# Altium footprint library TarabusLibrary.PcbLib: 591 footprints (part 11 of 37)
Each footprint in its own frame and in the unit in brackets; x right, y up, seen from the top. Pads: shape width x height; smd on the part's side, far side on the other; paste and mask are expansions set on the pad; w line width, h text height; cw(c..) or ccw(c..) is an arc to the next point about the centre after c.
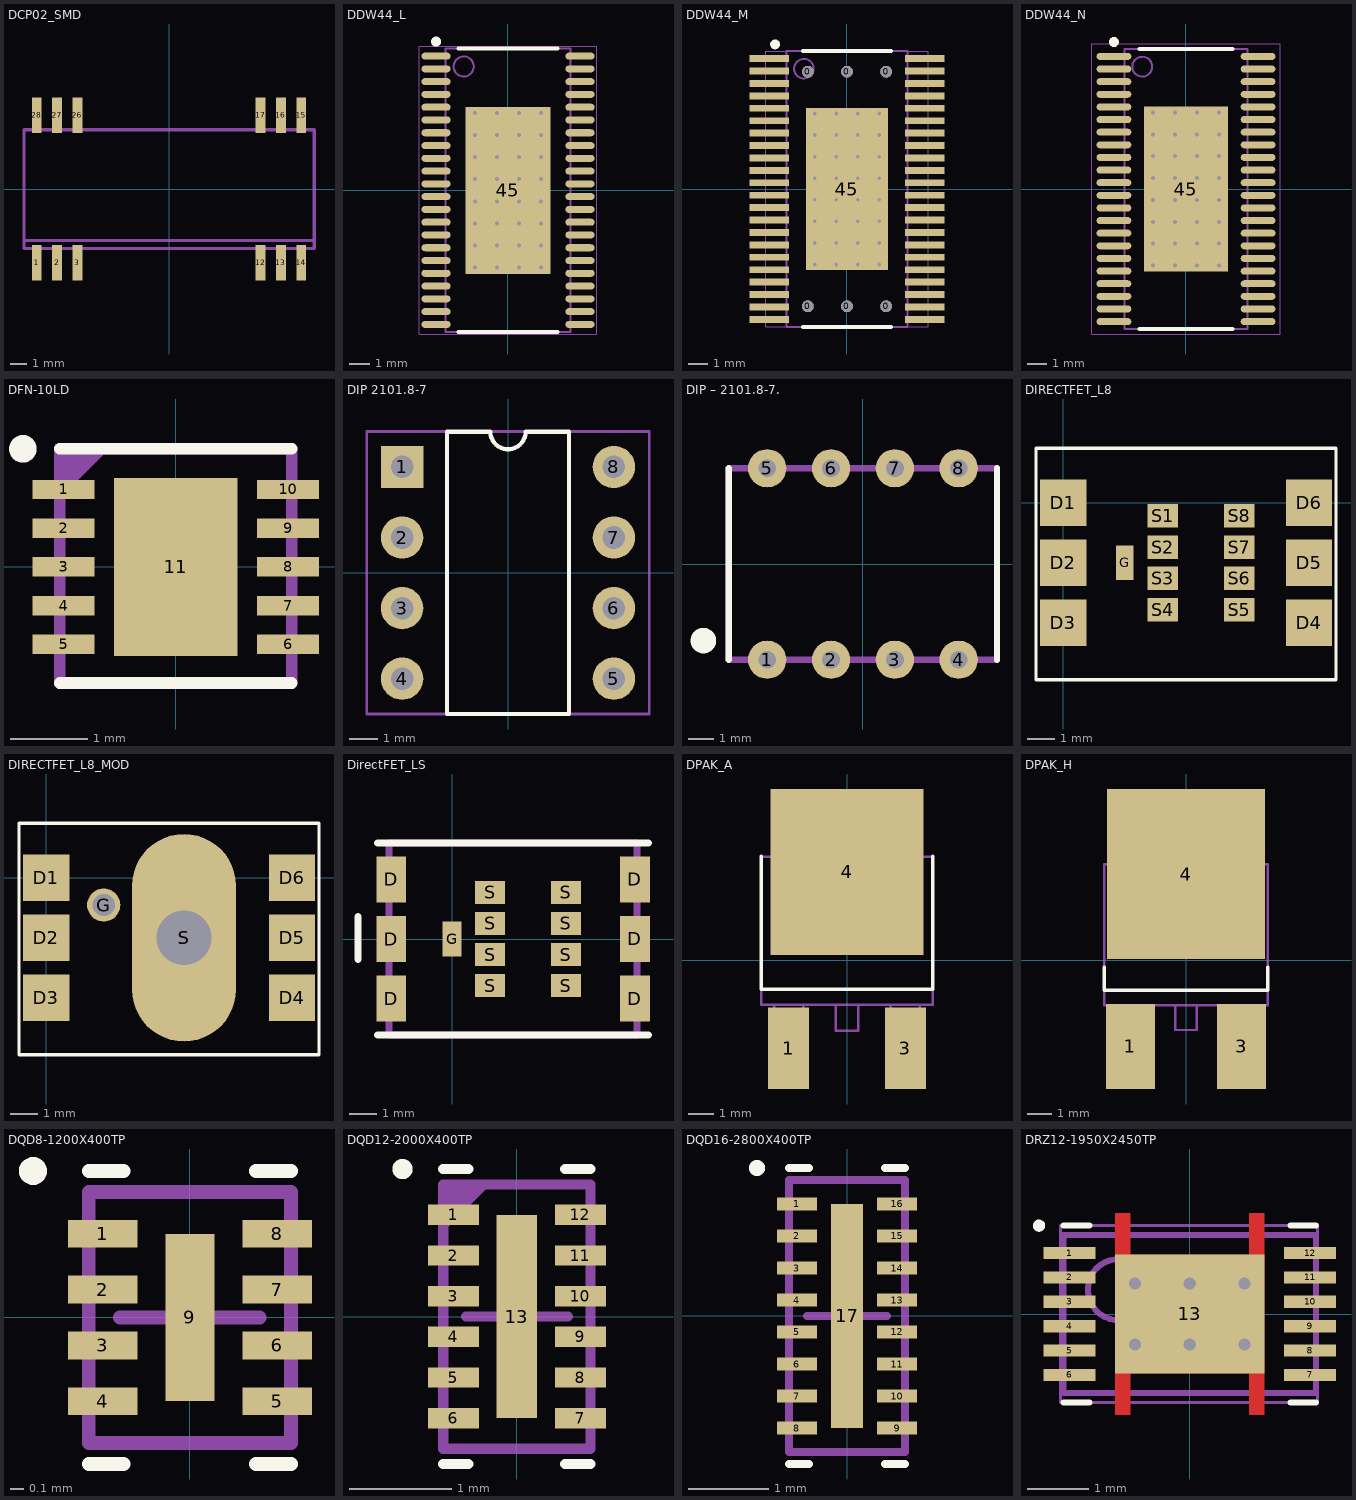
[diagram p10: the footprints below, top view; thin cyan lines are the x and y axes]

## DCP02_SMD [mil]
pads (12):
  rect 24x87 smd: 1(-325,-181.1) 2(-275,-181.1) 3(-225,-181.1) 12(225,-181.1) 13(275,-181.1) 14(325,-181.1) 15(325,182) 16(275,182) 17(225,182) 26(-225,182) 27(-275,182) 28(-325,182)
Mechanical 16:
  rectangle: -334.65,150 -315.35,210
  rectangle: -284.65,150 -265.35,210
  rectangle: -234.65,150 -215.35,210
  rectangle: 216,150 235,210
  rectangle: 266,150 285,210
  rectangle: 316,150 335,210
  rectangle: 316,-209.45 335,-149.61
  rectangle: 266,-209.45 285,-149.61
  rectangle: 216,-209.45 235,-149.61
  rectangle: -234.65,-209.45 -215.35,-149.61
  rectangle: -284.65,-209.45 -265.35,-149.61
  rectangle: -334.65,-209.45 -315.35,-149.61
  lines w8: -356.3,-125.98 357,-125.98 ; -356.3,-125.98 -356.3,146 357,146 357,-125.98 ; -356.3,-125.98 -356.3,-145.67 357,-145.67 357,-125.98

## DDW44_L [mm] "TSOP, 44-Leads, Body 14x6.1mm, Pitch 0.635mm, Thermal Pad 8.3x4.2mm, IPC High Density"
height 1.2
pads (45):
  oval 1.45x0.35 smd: 1(-3.575,6.667) 2(-3.575,6.032) 3(-3.575,5.397) 4(-3.575,4.763) 5(-3.575,4.127) 6(-3.575,3.492) 7(-3.575,2.857) 8(-3.575,2.222) 9(-3.575,1.587) 10(-3.575,0.953) 11(-3.575,0.318) 12(-3.575,-0.318) 13(-3.575,-0.953) 14(-3.575,-1.587) 15(-3.575,-2.222) 16(-3.575,-2.857) 17(-3.575,-3.492) 18(-3.575,-4.127) 19(-3.575,-4.763) 20(-3.575,-5.397) 21(-3.575,-6.032) 22(-3.575,-6.667) 23(3.575,-6.667) 24(3.575,-6.032) 25(3.575,-5.397) 26(3.575,-4.763) 27(3.575,-4.127) 28(3.575,-3.492) 29(3.575,-2.857) 30(3.575,-2.222) 31(3.575,-1.587) 32(3.575,-0.953) 33(3.575,-0.318) 34(3.575,0.318) 35(3.575,0.953) 36(3.575,1.587) 37(3.575,2.222) 38(3.575,2.857) 39(3.575,3.492) 40(3.575,4.127) 41(3.575,4.763) 42(3.575,5.397) 43(3.575,6.032) 44(3.575,6.667)
  rect 4.2x8.3 smd: 45(0,0)
via -0.55,1.65 diameter 0.5 hole 0.2
via -0.55,0.55 diameter 0.5 hole 0.2
via -0.55,-0.55 diameter 0.5 hole 0.2
via -0.55,-1.65 diameter 0.5 hole 0.2
via -0.55,-2.75 diameter 0.5 hole 0.2
via 0.55,-2.75 diameter 0.5 hole 0.2
via 0.55,-1.65 diameter 0.5 hole 0.2
via 0.55,-0.55 diameter 0.5 hole 0.2
via 0.55,0.55 diameter 0.5 hole 0.2
via 0.55,1.65 diameter 0.5 hole 0.2
via 0.55,2.75 diameter 0.5 hole 0.2
via -0.55,2.75 diameter 0.5 hole 0.2
via -1.65,2.75 diameter 0.5 hole 0.2
via -1.65,1.65 diameter 0.5 hole 0.2
via -1.65,0.55 diameter 0.5 hole 0.2
via -1.65,-0.55 diameter 0.5 hole 0.2
via -1.65,-1.65 diameter 0.5 hole 0.2
via -1.65,-2.75 diameter 0.5 hole 0.2
via -1.65,-3.85 diameter 0.5 hole 0.2
via -0.55,-3.85 diameter 0.5 hole 0.2
via 0.55,-3.85 diameter 0.5 hole 0.2
via 1.65,-3.85 diameter 0.5 hole 0.2
via 1.65,-2.75 diameter 0.5 hole 0.2
via 1.65,-1.65 diameter 0.5 hole 0.2
via 1.65,-0.55 diameter 0.5 hole 0.2
via 1.65,0.55 diameter 0.5 hole 0.2
via 1.65,1.65 diameter 0.5 hole 0.2
via 1.65,2.75 diameter 0.5 hole 0.2
via 1.65,3.85 diameter 0.5 hole 0.2
via 0.55,3.85 diameter 0.5 hole 0.2
via -0.55,3.85 diameter 0.5 hole 0.2
via -1.65,3.85 diameter 0.5 hole 0.2
Top Overlay:
  circle w0.25: c-3.575,7.392 r0.125
  lines w0.2: -2.45,-7.05 2.45,-7.05 ; -2.45,7.05 2.45,7.05
Mechanical 13:
  circle w0.1: c-2.2,6.15 r0.5
  lines w0.1: -3.1,-7.05 -3.1,7.05 3.1,7.05 3.1,-7.05 -3.1,-7.05
Mechanical 15:
  lines w0.05: -4.4,-7.15 -4.4,7.15 4.4,7.15 4.4,-7.15 -4.4,-7.15
  lines w0.1: -0.5,0 0.5,0 ; 0,-0.5 0,0.5
3D body: height 1.2, standoff 0.05, extent -3.1,-7.05 3.1,7.05

## DDW44_M [mm] "TSOP, 44-Leads, Body 14x6.1mm, Pitch 0.635mm, Thermal Pad 8.3x4.2mm, IPC Low Density"
height 1.2
pads (51):
  round 0.6 hole 0.6: 0(-2,-6) 0(-2,6) 0(0,-6) 0(0,6) 0(2,-6) 0(2,6)
  rect 2x0.35 smd: 1(-3.975,6.667) 2(-3.975,6.032) 3(-3.975,5.397) 4(-3.975,4.763) 5(-3.975,4.127) 6(-3.975,3.492) 7(-3.975,2.857) 8(-3.975,2.222) 9(-3.975,1.587) 10(-3.975,0.953) 11(-3.975,0.318) 12(-3.975,-0.318) 13(-3.975,-0.953) 14(-3.975,-1.587) 15(-3.975,-2.222) 16(-3.975,-2.857) 17(-3.975,-3.492) 18(-3.975,-4.127) 19(-3.975,-4.763) 20(-3.975,-5.397) 21(-3.975,-6.032) 22(-3.975,-6.667) 23(3.975,-6.667) 24(3.975,-6.032) 25(3.975,-5.397) 26(3.975,-4.763) 27(3.975,-4.127) 28(3.975,-3.492) 29(3.975,-2.857) 30(3.975,-2.222) 31(3.975,-1.587) 32(3.975,-0.953) 33(3.975,-0.318) 34(3.975,0.318) 35(3.975,0.953) 36(3.975,1.587) 37(3.975,2.222) 38(3.975,2.857) 39(3.975,3.492) 40(3.975,4.127) 41(3.975,4.763) 42(3.975,5.397) 43(3.975,6.032) 44(3.975,6.667)
  rect 4.2x8.3 smd: 45(0,0)
via -0.55,1.65 diameter 0.5 hole 0.2
via -0.55,0.55 diameter 0.5 hole 0.2
via -0.55,-0.55 diameter 0.5 hole 0.2
via -0.55,-1.65 diameter 0.5 hole 0.2
via -0.55,-2.75 diameter 0.5 hole 0.2
via 0.55,-2.75 diameter 0.5 hole 0.2
via 0.55,-1.65 diameter 0.5 hole 0.2
via 0.55,-0.55 diameter 0.5 hole 0.2
via 0.55,0.55 diameter 0.5 hole 0.2
via 0.55,1.65 diameter 0.5 hole 0.2
via 0.55,2.75 diameter 0.5 hole 0.2
via -0.55,2.75 diameter 0.5 hole 0.2
via -1.65,2.75 diameter 0.5 hole 0.2
via -1.65,1.65 diameter 0.5 hole 0.2
via -1.65,0.55 diameter 0.5 hole 0.2
via -1.65,-0.55 diameter 0.5 hole 0.2
via -1.65,-1.65 diameter 0.5 hole 0.2
via -1.65,-2.75 diameter 0.5 hole 0.2
via -1.65,-3.85 diameter 0.5 hole 0.2
via -0.55,-3.85 diameter 0.5 hole 0.2
via 0.55,-3.85 diameter 0.5 hole 0.2
via 1.65,-3.85 diameter 0.5 hole 0.2
via 1.65,-2.75 diameter 0.5 hole 0.2
via 1.65,-1.65 diameter 0.5 hole 0.2
via 1.65,-0.55 diameter 0.5 hole 0.2
via 1.65,0.55 diameter 0.5 hole 0.2
via 1.65,1.65 diameter 0.5 hole 0.2
via 1.65,2.75 diameter 0.5 hole 0.2
via 1.65,3.85 diameter 0.5 hole 0.2
via 0.55,3.85 diameter 0.5 hole 0.2
via -0.55,3.85 diameter 0.5 hole 0.2
via -1.65,3.85 diameter 0.5 hole 0.2
Top Overlay:
  circle w0.25: c-3.675,7.392 r0.125
  lines w0.2: -2.25,-7.05 2.25,-7.05 ; -2.25,7.05 2.25,7.05
Mechanical 7:
  lines w0.05: -4.15,-7.05 4.15,-7.05 4.15,7.05 -4.15,7.05 -4.15,-7.05
  lines w0.1: -0.5,0 0.5,0 ; 0,-0.5 0,0.5
Mechanical 9:
  circle w0.1: c-2.2,6.15 r0.5
  lines w0.1: -3.1,-7.05 -3.1,7.05 3.1,7.05 3.1,-7.05 -3.1,-7.05
3D body: height 1.2, standoff 0.05, extent -3.1,-7.05 3.1,7.05
3D body: height 0.7, standoff 0, extent -4.15,6.5 -3.1,6.825
3D body: height 0.7, standoff 0, extent -4.15,5.875 -3.1,6.2
3D body: height 0.7, standoff 0, extent -4.15,5.225 -3.1,5.55
3D body: height 0.7, standoff 0, extent -4.15,4.613 -3.1,4.938
3D body: height 0.7, standoff 0, extent -4.15,3.95 -3.1,4.275
3D body: height 0.7, standoff 0, extent -4.15,0.775 -3.1,1.1
3D body: height 0.7, standoff 0, extent -4.15,1.438 -3.1,1.763
3D body: height 0.7, standoff 0, extent -4.15,2.05 -3.1,2.375
3D body: height 0.7, standoff 0, extent -4.15,2.7 -3.1,3.025
3D body: height 0.7, standoff 0, extent -4.15,3.325 -3.1,3.65
3D body: height 0.7, standoff 0, extent -4.125,-2.4 -3.075,-2.075
3D body: height 0.7, standoff 0, extent -4.125,-1.737 -3.075,-1.412
3D body: height 0.7, standoff 0, extent -4.125,-1.125 -3.075,-0.8
3D body: height 0.7, standoff 0, extent -4.125,-0.475 -3.075,-0.15
3D body: height 0.7, standoff 0, extent -4.125,0.15 -3.075,0.475
3D body: height 0.7, standoff 0, extent -4.15,-5.562 -3.1,-5.237
3D body: height 0.7, standoff 0, extent -4.15,-4.937 -3.1,-4.612
3D body: height 0.7, standoff 0, extent -4.15,-4.3 -3.1,-3.975
3D body: height 0.7, standoff 0, extent -4.15,-3.662 -3.1,-3.337
3D body: height 0.7, standoff 0, extent -4.15,-3.012 -3.1,-2.687
3D body: height 0.7, standoff 0, extent -4.15,-6.8 -3.1,-6.475
3D body: height 0.7, standoff 0, extent -4.15,-6.187 -3.1,-5.862
3D body: height 0.7, standoff 0, extent 3.1,-6.212 4.15,-5.887
3D body: height 0.7, standoff 0, extent 3.1,-6.825 4.15,-6.5
3D body: height 0.7, standoff 0, extent 3.1,-3.037 4.15,-2.712
3D body: height 0.7, standoff 0, extent 3.1,-3.687 4.15,-3.362
3D body: height 0.7, standoff 0, extent 3.1,-4.325 4.15,-4
3D body: height 0.7, standoff 0, extent 3.1,-4.962 4.15,-4.637
3D body: height 0.7, standoff 0, extent 3.1,-5.587 4.15,-5.262
3D body: height 0.7, standoff 0, extent 3.125,0.125 4.175,0.45
3D body: height 0.7, standoff 0, extent 3.125,-0.5 4.175,-0.175
3D body: height 0.7, standoff 0, extent 3.125,-1.15 4.175,-0.825
3D body: height 0.7, standoff 0, extent 3.125,-1.762 4.175,-1.437
3D body: height 0.7, standoff 0, extent 3.125,-2.425 4.175,-2.1
3D body: height 0.7, standoff 0, extent 3.1,3.3 4.15,3.625
3D body: height 0.7, standoff 0, extent 3.1,2.675 4.15,3
3D body: height 0.7, standoff 0, extent 3.1,2.025 4.15,2.35
3D body: height 0.7, standoff 0, extent 3.1,1.413 4.15,1.738
3D body: height 0.7, standoff 0, extent 3.1,0.75 4.15,1.075
3D body: height 0.7, standoff 0, extent 3.1,3.925 4.15,4.25
3D body: height 0.7, standoff 0, extent 3.1,4.588 4.15,4.913
3D body: height 0.7, standoff 0, extent 3.1,5.2 4.15,5.525
3D body: height 0.7, standoff 0, extent 3.1,5.85 4.15,6.175
3D body: height 0.7, standoff 0, extent 3.1,6.475 4.15,6.8

## DDW44_N [mm] "TSOP, 44-Leads, Body 14x6.1mm, Pitch 0.635mm, Thermal Pad 8.3x4.2mm, IPC Medium Density"
height 1.2
pads (45):
  oval 1.75x0.35 smd: 1(-3.625,6.667) 2(-3.625,6.032) 3(-3.625,5.397) 4(-3.625,4.763) 5(-3.625,4.127) 6(-3.625,3.492) 7(-3.625,2.857) 8(-3.625,2.222) 9(-3.625,1.587) 10(-3.625,0.953) 11(-3.625,0.318) 12(-3.625,-0.318) 13(-3.625,-0.953) 14(-3.625,-1.587) 15(-3.625,-2.222) 16(-3.625,-2.857) 17(-3.625,-3.492) 18(-3.625,-4.127) 19(-3.625,-4.763) 20(-3.625,-5.397) 21(-3.625,-6.032) 22(-3.625,-6.667) 23(3.625,-6.667) 24(3.625,-6.032) 25(3.625,-5.397) 26(3.625,-4.763) 27(3.625,-4.127) 28(3.625,-3.492) 29(3.625,-2.857) 30(3.625,-2.222) 31(3.625,-1.587) 32(3.625,-0.953) 33(3.625,-0.318) 34(3.625,0.318) 35(3.625,0.953) 36(3.625,1.587) 37(3.625,2.222) 38(3.625,2.857) 39(3.625,3.492) 40(3.625,4.127) 41(3.625,4.763) 42(3.625,5.397) 43(3.625,6.032) 44(3.625,6.667)
  rect 4.2x8.3 smd: 45(0,0)
via -0.55,1.65 diameter 0.5 hole 0.2
via -0.55,0.55 diameter 0.5 hole 0.2
via -0.55,-0.55 diameter 0.5 hole 0.2
via -0.55,-1.65 diameter 0.5 hole 0.2
via -0.55,-2.75 diameter 0.5 hole 0.2
via 0.55,-2.75 diameter 0.5 hole 0.2
via 0.55,-1.65 diameter 0.5 hole 0.2
via 0.55,-0.55 diameter 0.5 hole 0.2
via 0.55,0.55 diameter 0.5 hole 0.2
via 0.55,1.65 diameter 0.5 hole 0.2
via 0.55,2.75 diameter 0.5 hole 0.2
via -0.55,2.75 diameter 0.5 hole 0.2
via -1.65,2.75 diameter 0.5 hole 0.2
via -1.65,1.65 diameter 0.5 hole 0.2
via -1.65,0.55 diameter 0.5 hole 0.2
via -1.65,-0.55 diameter 0.5 hole 0.2
via -1.65,-1.65 diameter 0.5 hole 0.2
via -1.65,-2.75 diameter 0.5 hole 0.2
via -1.65,-3.85 diameter 0.5 hole 0.2
via -0.55,-3.85 diameter 0.5 hole 0.2
via 0.55,-3.85 diameter 0.5 hole 0.2
via 1.65,-3.85 diameter 0.5 hole 0.2
via 1.65,-2.75 diameter 0.5 hole 0.2
via 1.65,-1.65 diameter 0.5 hole 0.2
via 1.65,-0.55 diameter 0.5 hole 0.2
via 1.65,0.55 diameter 0.5 hole 0.2
via 1.65,1.65 diameter 0.5 hole 0.2
via 1.65,2.75 diameter 0.5 hole 0.2
via 1.65,3.85 diameter 0.5 hole 0.2
via 0.55,3.85 diameter 0.5 hole 0.2
via -0.55,3.85 diameter 0.5 hole 0.2
via -1.65,3.85 diameter 0.5 hole 0.2
Top Overlay:
  circle w0.25: c-3.625,7.392 r0.125
  lines w0.2: -2.35,-7.05 2.35,-7.05 ; -2.35,7.05 2.35,7.05
Mechanical 13:
  circle w0.1: c-2.2,6.15 r0.5
  lines w0.1: -3.1,-7.05 -3.1,7.05 3.1,7.05 3.1,-7.05 -3.1,-7.05
Mechanical 15:
  lines w0.05: -4.75,-7.3 -4.75,7.3 4.75,7.3 4.75,-7.3 -4.75,-7.3
  lines w0.1: -0.5,0 0.5,0 ; 0,-0.5 0,0.5
3D body: height 1.2, standoff 0.05, extent -3.1,-7.05 3.1,7.05

## DFN-10LD [mm] "10 LEAD DUAL FLAT PACKAGE"
height 0.9
pads (11):
  rect 0.8x0.25 smd mask+0.05: 1(-1.45,1) 2(-1.45,0.5) 3(-1.45,0) 4(-1.45,-0.5) 5(-1.45,-1) 6(1.45,-1) 7(1.45,-0.5) 8(1.45,0) 9(1.45,0.5) 10(1.45,1)
  rect 1.6x2.3 smd mask+0.05: 11(0,0)
Top Overlay:
  circle w0.254: c-1.975,1.525 r0.05
  lines w0.15: -1.5,-1.5 1.5,-1.5 ; -1.5,1.525 1.5,1.525
Mechanical 7:
  lines w0.15: -1.5,1.5 -1.5,-1.5 1.5,-1.5 1.5,1.5 ; -1.5,1.525 1.5,1.525 ; -1.486,1.302 -1.269,1.519 ; -1.483,1.002 -0.968,1.518 ; -1.473,1.177 -1.138,1.512
Mechanical 10:
  text ".Designator" at -0.85,-2.075 h0.7
  text ".Comment" at -0.525,2.025 h0.7
3D body: height 0.8, standoff 0, extent -1.505,-1.5 1.5,1.525

## DIP 2101.8-7 [mm]
pads (8):
  rect 1.5x1.5 hole 0.8: 1(-3.75,3.75)
  round 1.5 hole 0.8: 2(-3.75,1.25) 3(-3.75,-1.25) 4(-3.75,-3.75) 5(3.75,-3.75) 6(3.75,-1.25) 7(3.75,1.25) 8(3.75,3.75)
Top Overlay:
  lines w0.15: -2.165,-5 2.165,-5 2.165,5 0.625,5 cw(c0,5) -0.625,5 -2.165,5 -2.165,-5
Mechanical 7:
  lines w0.1: -2.165,-5 -2.165,5 ; -0.625,5 ccw(c0,5) 0.625,5 ; 2.165,-5 2.165,5 ; -5,-5 -5,5 5,5 5,-5 -5,-5
  text ".Designator" at -0.53,0.57 h0.8

## DIP – 2101.8-7. [mm]
pads (8):
  round 1.5 hole 0.7: 1(-3.75,-3.75) 2(-1.25,-3.75) 3(1.25,-3.75) 4(3.75,-3.75) 5(-3.75,3.75) 6(-1.25,3.75) 7(1.25,3.75) 8(3.75,3.75)
Top Overlay:
  circle w0.5: c-6.25,-3 r0.25
  lines w0.254: -5.25,-3.75 -5.25,3.75 ; 5.25,-3.75 5.25,3.75
Mechanical 7:
  lines w0.254: 1.25,3.75 5.25,3.75 ; 5.25,3.75 5.25,-3.75 -5.25,-3.75 -5.25,3.75 5.25,3.75
Mechanical 10:
  text ".Designator" at -1.75,-6.25 h1
  text ".Comment" at -1.25,5.75 h1
3D body: height 3.1, standoff 0.05, extent -5.25,-3.75 5.25,3.75

## DIRECTFET_L8 [mil]
pads (15):
  rect 67x67 smd: D1(0,0) D2(0,-86.61) D3(0,-173.23) D4(355,-173.23) D5(355,-86.61) D6(355,0)
  rect 25x50 smd: G(89,-86.61)
  rect 44x34 smd: S1(144,-18.7) S2(144,-63.98) S3(144,-109.25) S4(144,-154.53) S5(254,-154.53) S6(254,-109.25) S7(254,-63.98) S8(254,-18.7)
Top Overlay:
  lines w5: -39.37,-255.91 394,-255.91 394,79 -39.37,79 -39.37,-255.91

## DIRECTFET_L8_MOD [mil]
pads (8):
  rect 67x67 smd: D1(0,0) D2(0,-86.61) D3(0,-173.23) D4(355,-173.23) D5(355,-86.61) D6(355,0)
  round 48 hole 32: G(83,-39.37)
  oval 150x300 hole 79: S(199,-86.61)
Top Overlay:
  lines w5: -39.37,-255.91 394,-255.91 394,79 -39.37,79 -39.37,-255.91

## DirectFET_LS [mm]
height 0.7
pads (15):
  rect 1.1x1.7 smd: D(-2.25,-2.2) D(-2.25,0) D(-2.25,2.2) D(6.75,-2.2) D(6.75,0) D(6.75,2.2)
  rect 0.7x1.3 smd: G(0,0)
  rect 1.1x0.85 smd: S(1.4,-1.725) S(1.4,-0.575) S(1.4,0.575) S(1.4,1.725) S(4.2,-1.725) S(4.2,-0.575) S(4.2,0.575) S(4.2,1.725)
Top Overlay:
  lines w0.254: -3.475,-0.75 -3.475,0.825 ; -2.75,-3.55 7.25,-3.55 ; -2.75,3.55 7.25,3.55
Mechanical 7:
  lines w0.254: -2.325,-3.55 6.825,-3.55 6.825,3.55 -2.325,3.55 -2.325,-3.55
3D body: height 0.3, standoff 0.05, extent 6.125,-3 6.825,3.025
3D body: height 0.3, standoff 0.05, extent -2.3,-3 -1.6,3.025
3D body: height 0.7, standoff 0.05, extent -1.625,-3.55 6.125,3.55

## DPAK_A [mm]
height 2.4
pads (3):
  rect 1.6x3.2 smd: 1(-2.285,-3.45) 3(2.285,-3.45)
  rect 6x6.5 smd: 4(0,3.45)
Top Overlay:
  lines w0.15: -3.36,4.05 -3.36,-1.14 3.36,-1.14 3.36,4.05
Mechanical 7:
  lines w0.1: -2.855,-1.75 -2.855,-4.34 -1.715,-4.34 -1.715,-1.75 ; -2.73,4.05 -2.73,6.08 2.73,6.08 2.73,4.05 ; -0.44,-1.75 -0.44,-2.77 0.44,-2.77 0.44,-1.75 ; 1.715,-1.75 1.715,-4.34 2.855,-4.34 2.855,-1.75 ; -3.36,-1.75 3.36,-1.75 3.36,4.05 -3.36,4.05 -3.36,-1.75
Mechanical 10:
  text ".Comment" at -0.73,7.09 h0.6
  text ".Designator" at -0.8,7.82 h0.8
3D body: height 2.4, standoff 0, extent -3.36,-1.75 3.36,4.05
3D body: height 0.7, standoff 0, extent -2.73,4.05 2.73,6.08
3D body: height 1.5, standoff 0, extent -2.855,-4.34 -1.715,-1.75
3D body: height 1.5, standoff 0, extent 1.715,-4.34 2.855,-1.75
3D body: height 1.5, standoff 0.5, extent -0.44,-2.77 0.44,-1.75

## DPAK_H [mm]
height 2.4
pads (3):
  rect 2x3.5 smd: 1(-2.285,-3.55) 3(2.285,-3.55)
  rect 6.5x7 smd: 4(0,3.55)
Top Overlay:
  lines w0.15: -3.36,-0.3 -3.36,-1.24 3.36,-1.24 3.36,-0.3
Mechanical 7:
  lines w0.1: -2.855,-1.85 -2.855,-4.44 -1.715,-4.44 -1.715,-1.85 ; -2.73,3.95 -2.73,5.98 2.73,5.98 2.73,3.95 ; -0.44,-1.85 -0.44,-2.87 0.44,-2.87 0.44,-1.85 ; 1.715,-1.85 1.715,-4.44 2.855,-4.44 2.855,-1.85 ; -3.36,-1.85 -3.36,3.95 3.36,3.95 3.36,-1.85 -3.36,-1.85
Mechanical 10:
  text ".Comment" at -0.73,7.63 h0.6
  text ".Designator" at -0.85,8.28 h0.8
3D body: height 2.4, standoff 0, extent -3.36,-1.85 3.36,3.95
3D body: height 0.7, standoff 0, extent -2.73,3.95 2.73,5.98
3D body: height 1.5, standoff 0, extent -2.855,-4.44 -1.715,-1.85
3D body: height 1.5, standoff 0, extent 1.715,-4.44 2.855,-1.85
3D body: height 1.5, standoff 0.5, extent -0.44,-2.87 0.44,-1.85

## DQD8-1200X400TP [mm] "SON, 8-Leads, Body 1.35x1.7mm, Pitch 0.4mm, Thermal Pad 1.2x0.4mm, TI Recommended"
height 0.8
pads (9):
  rect 0.5x0.2 smd paste+0 mask+0.05: 1(-0.625,0.6) 2(-0.625,0.2) 3(-0.625,-0.2) 4(-0.625,-0.6) 5(0.625,-0.6) 6(0.625,-0.2) 7(0.625,0.2) 8(0.625,0.6)
  rect 0.35x1.2 smd paste-0.175 mask+0.05: 9(0,0)
Top Overlay:
  circle w0.1: c-1.125,1.05 r0.05
  lines w0.1: -0.725,-1.05 -0.475,-1.05 ; -0.725,1.05 -0.475,1.05 ; 0.475,-1.05 0.725,-1.05 ; 0.475,1.05 0.725,1.05
Top Paste:
  region: 0.15,-0.05 -0.15,-0.05 -0.15,-0.55 0.15,-0.55
  rectangle: -0.15,0.05 0.15,0.55
Mechanical 7:
  lines w0.05: -0.725,-0.9 -0.725,0.9 0.725,0.9 0.725,-0.9 -0.725,-0.9
  lines w0.1: -0.5,0 0.5,0 ; 0,-0.5 0,0.5
Mechanical 9:
  lines w0.1: -0.725,-0.9 -0.725,0.9 0.725,0.9 0.725,-0.9 -0.725,-0.9
Mechanical 10:
  text ".Comment" at -0.975,1.35 h0.7
  text ".Designator" at -1.075,-1.65 h0.7
3D body: height 0.8, standoff 0, extent -0.725,-0.9 0.725,0.9

## DQD12-2000X400TP [mm] "SON, 12-Leads, Body 1.35x2.5mm, Pitch 0.4mm, Thermal Pad 2x0.4mm, TI Recommended"
height 0.8
pads (13):
  rect 0.5x0.2 smd paste+0 mask+0.05: 1(-0.625,1) 2(-0.625,0.6) 3(-0.625,0.2) 4(-0.625,-0.2) 5(-0.625,-0.6) 6(-0.625,-1) 7(0.625,-1) 8(0.625,-0.6) 9(0.625,-0.2) 10(0.625,0.2) 11(0.625,0.6) 12(0.625,1)
  rect 0.4x2 smd paste-0.2 mask+0.05: 13(0,0)
Top Overlay:
  circle w0.1: c-1.125,1.45 r0.05
  lines w0.1: -0.725,-1.45 -0.475,-1.45 ; -0.725,1.45 -0.475,1.45 ; 0.475,-1.45 0.725,-1.45 ; 0.475,1.45 0.725,1.45
Top Paste:
  rectangle: -0.15,-0.275 0.15,0.275
  rectangle: -0.15,0.405 0.15,0.955
  region: 0.15,-0.405 -0.15,-0.405 -0.15,-0.955 0.15,-0.955
Mechanical 7:
  lines w0.05: -0.725,-1.3 0.725,-1.3 0.725,1.3 -0.725,1.3 -0.725,-1.3
  lines w0.1: -0.7,0.925 -0.35,1.275 ; -0.7,1.025 -0.45,1.275 ; -0.7,1.1 -0.525,1.275 ; -0.7,1.2 -0.625,1.275 ; -0.5,0 0.5,0 ; 0,-0.5 0,0.5
Mechanical 9:
  lines w0.1: -0.725,-1.3 0.725,-1.3 0.725,1.3 -0.725,1.3 -0.725,-1.3
Mechanical 10:
  text ".Comment" at -0.6,1.725 h0.7
  text ".Designator" at -0.95,-2.05 h0.7
3D body: height 0.8, standoff 0, extent -0.725,-1.3 0.725,1.3

## DQD16-2800X400TP [mm] "SON, 16-Leads, Body 1.35x3.3mm, Pitch 0.4mm, Thermal Pad 2.8x0.4mm, TI Recommended"
height 0.8
pads (17):
  rect 0.5x0.16 smd paste+0 mask+0.05: 1(-0.625,1.4) 2(-0.625,1) 3(-0.625,0.6) 4(-0.625,0.2) 5(-0.625,-0.2) 6(-0.625,-0.6) 7(-0.625,-1) 8(-0.625,-1.4) 9(0.625,-1.4) 10(0.625,-1) 11(0.625,-0.6) 12(0.625,-0.2) 13(0.625,0.2) 14(0.625,0.6) 15(0.625,1) 16(0.625,1.4)
  rect 0.4x2.8 smd paste-1.4 mask+0.05: 17(0,0)
Top Overlay:
  circle w0.1: c-1.125,1.85 r0.05
  lines w0.1: -0.725,-1.85 -0.475,-1.85 ; -0.725,1.85 -0.475,1.85 ; 0.475,-1.85 0.725,-1.85 ; 0.475,1.85 0.725,1.85
Top Paste:
  rectangle: -0.15,0.75 0.15,1.35
  region: 0.15,-0.75 -0.15,-0.75 -0.15,-1.35 0.15,-1.35
  region: 0.15,-0.05 -0.15,-0.05 -0.15,-0.65 0.15,-0.65
  rectangle: -0.15,0.05 0.15,0.65
Mechanical 7:
  lines w0.05: -0.725,-1.7 -0.725,1.7 0.725,1.7 0.725,-1.7 -0.725,-1.7
  lines w0.1: -0.5,0 0.5,0 ; 0,-0.5 0,0.5
Mechanical 9:
  lines w0.1: -0.725,-1.7 -0.725,1.7 0.725,1.7 0.725,-1.7 -0.725,-1.7
Mechanical 10:
  text ".Designator" at -0.85,-2.45 h0.7
  text ".Comment" at -0.875,2.15 h0.7
3D body: height 0.8, standoff 0, extent -0.725,-1.7 0.725,1.7

## DRZ12-1950X2450TP [mm] "SON, 12-Leads, Body 4x2.5mm, Pitch 0.4mm, Thermal Pad 1.95x2.45mm, TI Recommended"
height 1
pads (13):
  rect 0.85x0.2 smd paste-0.1 mask+0.05: 1(-1.975,1) 2(-1.975,0.6) 3(-1.975,0.2) 4(-1.975,-0.2) 5(-1.975,-0.6) 6(-1.975,-1) 7(1.975,-1) 8(1.975,-0.6) 9(1.975,-0.2) 10(1.975,0.2) 11(1.975,0.6) 12(1.975,1)
  rect 2.45x1.95 smd paste-0.975 mask+0.05: 13(0,0)
via 0,-0.5 diameter 0.5 hole 0.2
via -0.9,-0.5 diameter 0.5 hole 0.2
via 0,0.5 diameter 0.5 hole 0.2
via -0.9,0.5 diameter 0.5 hole 0.2
via 0.9,0.5 diameter 0.5 hole 0.2
via 0.9,-0.5 diameter 0.5 hole 0.2
Top Layer:
  region: -1.225,-1.65 -1.225,1.65 -0.975,1.65 -0.975,0.975 0.975,0.975 0.975,1.65 1.225,1.65 1.225,-1.65 0.975,-1.65 0.975,-0.975 -0.975,-0.975 -0.975,-1.65
Top Overlay:
  circle w0.1: c-2.475,1.45 r0.05
  lines w0.1: -2.075,-1.45 -1.65,-1.45 ; -2.075,1.45 -1.65,1.45 ; 1.65,-1.45 2.075,-1.45 ; 1.65,1.45 2.075,1.45
Top Paste:
  region: 1.225,1.625 0.975,1.625 0.975,1.1 1.225,1.1
  region: 1.225,-1.1 0.975,-1.1 0.975,-1.625 1.225,-1.625
  rectangle: -1.225,-1.625 -0.975,-1.1
  rectangle: -1.225,1.1 -0.975,1.625
  rectangle: -1.1,-0.9 -0.1,-0.1
  region: 1.1,-0.1 0.1,-0.1 0.1,-0.9 1.1,-0.9
  region: 1.1,0.9 0.1,0.9 0.1,0.1 1.1,0.1
  rectangle: -1.1,0.1 -0.1,0.9
  lines w0.2: -2.275,-1 -1.675,-1 ; -2.275,-0.6 -1.675,-0.6 ; -2.275,-0.2 -1.675,-0.2 ; -2.275,0.2 -1.675,0.2 ; -2.275,0.6 -1.675,0.6 ; -2.275,1 -1.675,1 ; 1.675,-1 2.275,-1 ; 1.675,-0.6 2.275,-0.6 ; 1.675,-0.2 2.275,-0.2 ; 1.675,0.2 2.275,0.2 ; 1.675,0.6 2.275,0.6 ; 1.675,1 2.275,1
Mechanical 7:
  lines w0.05: -2.125,-1.45 2.1,-1.45 2.1,1.45 -2.125,1.45 -2.125,-1.45
  lines w0.1: -0.5,0 0.5,0 ; 0,-0.5 0,0.5
Mechanical 13:
  circle w0.1: c-1.175,0.4 r0.5
  lines w0.1: -2.075,-1.3 2.075,-1.3 2.075,1.3 -2.075,1.3 -2.075,-1.3
3D body: height 1, standoff 0, extent -2.075,-1.3 2.075,1.3